# Altium footprint library ACTION_PinHeader.PcbLib: 155 footprints (part 5 of 10)
Each footprint in its own frame and in the unit in brackets; x right, y up, seen from the top. Pads: shape width x height; smd on the part's side, far side on the other; paste and mask are expansions set on the pad; w line width, h text height; cw(c..) or ccw(c..) is an arc to the next point about the centre after c.
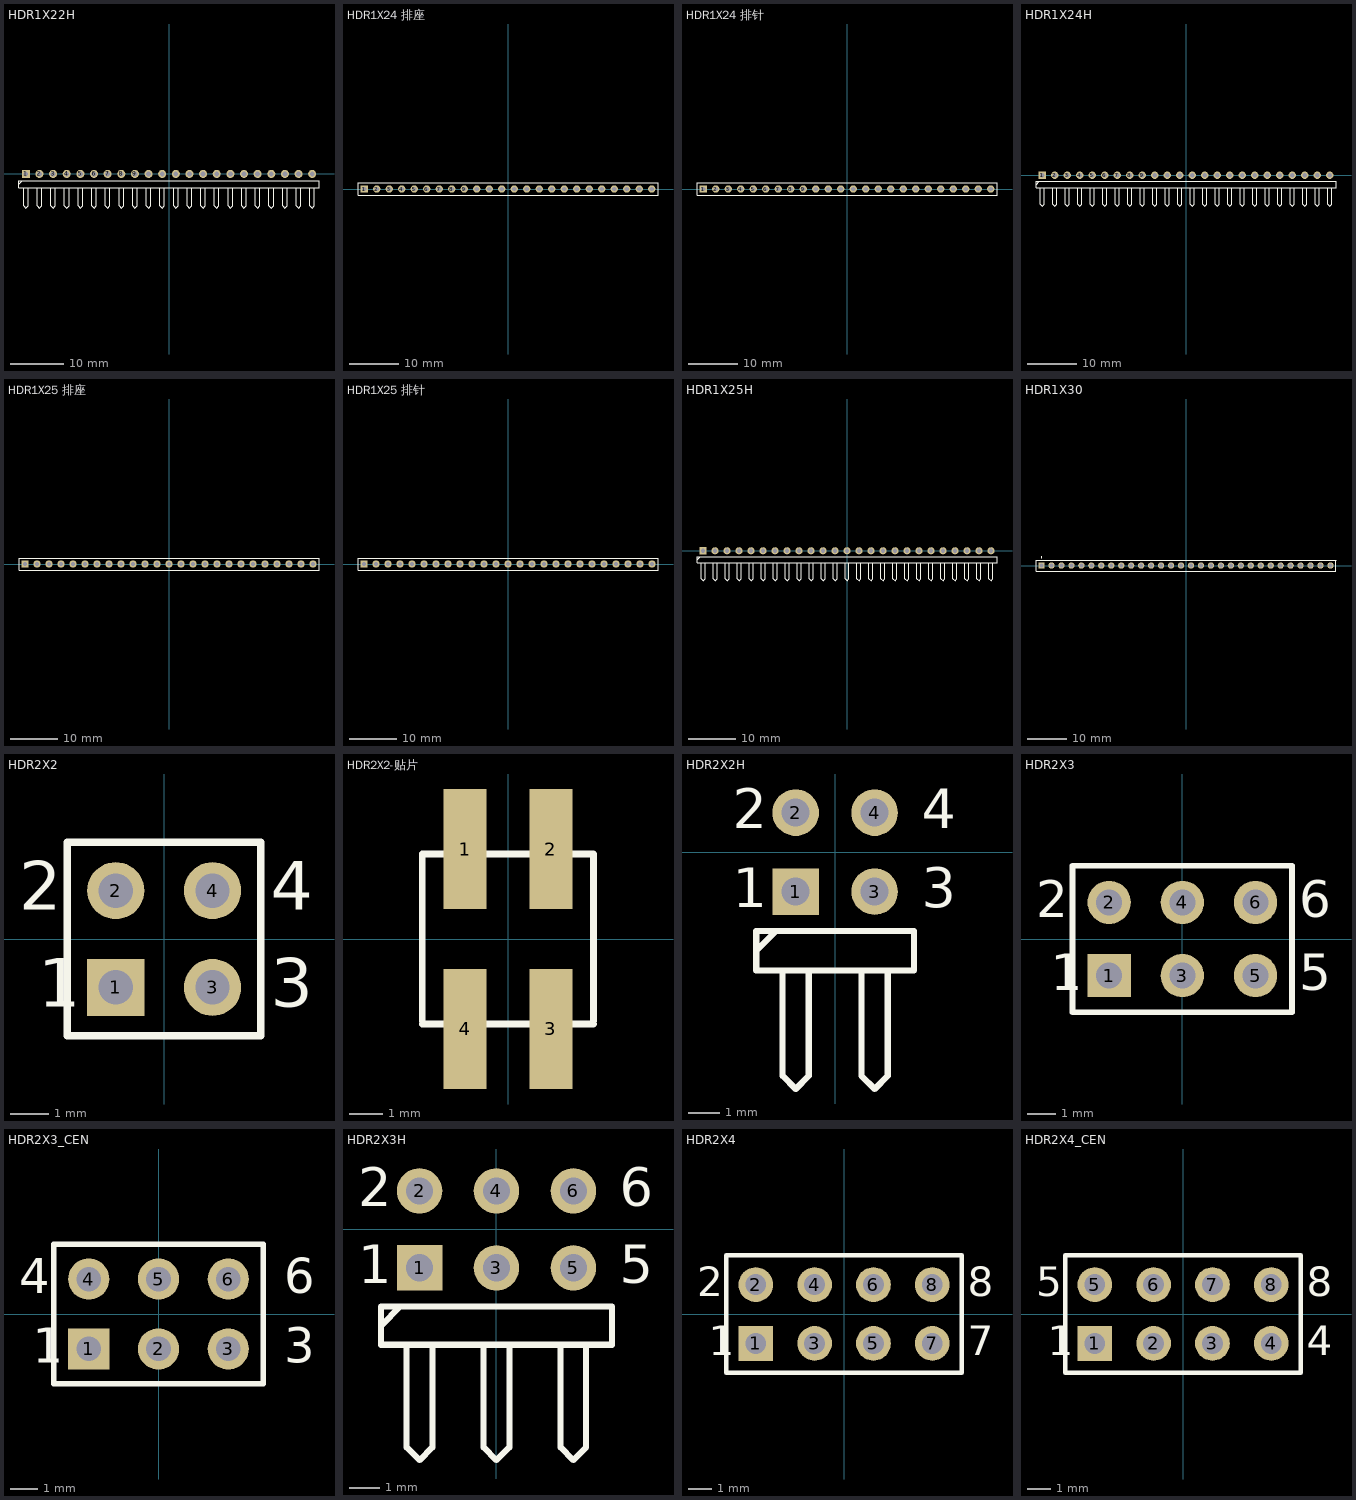
[diagram p4: the footprints below, top view; thin cyan lines are the x and y axes]

## HDR1X22H [mm] "Connector; Header; 22 Position; Right Angle"
pads (22):
  rect 1.5x1.5 hole 0.9: 1(-26.67,0)
  round 1.5 hole 0.9: 2(-24.13,0) 3(-21.59,0) 4(-19.05,0) 5(-16.51,0) 6(-13.97,0) 7(-11.43,0) 8(-8.89,0) 9(-6.35,0) 10(-3.81,0) 11(-1.27,0) 12(1.27,0) 13(3.81,0) 14(6.35,0) 15(8.89,0) 16(11.43,0) 17(13.97,0) 18(16.51,0) 19(19.05,0) 20(21.59,0) 21(24.13,0) 22(26.67,0)
Top Overlay:
  lines w0.2: -27.94,-1.905 -27.305,-1.27 ; -27.093,-2.54 -27.093,-5.927 -26.67,-6.35 -26.247,-5.927 -26.247,-2.54 ; -24.553,-2.54 -24.553,-5.927 -24.13,-6.35 -23.707,-5.927 -23.707,-2.54 ; -22.013,-2.54 -22.013,-5.927 -21.59,-6.35 -21.167,-5.927 -21.167,-2.54 ; -19.473,-2.54 -19.473,-5.927 -19.05,-6.35 -18.627,-5.927 -18.627,-2.54 ; -16.933,-2.54 -16.933,-5.927 -16.51,-6.35 -16.087,-5.927 -16.087,-2.54 ; -14.393,-2.54 -14.393,-5.927 -13.97,-6.35 -13.547,-5.927 -13.547,-2.54 ; -11.853,-2.54 -11.853,-5.927 -11.43,-6.35 -11.007,-5.927 -11.007,-2.54 ; -9.313,-2.54 -9.313,-5.927 -8.89,-6.35 -8.467,-5.927 -8.467,-2.54 ; -6.773,-2.54 -6.773,-5.927 -6.35,-6.35 -5.927,-5.927 -5.927,-2.54 ; -4.233,-2.54 -4.233,-5.927 -3.81,-6.35 -3.387,-5.927 -3.387,-2.54 ; -1.693,-2.54 -1.693,-5.927 -1.27,-6.35 -0.847,-5.927 -0.847,-2.54 ; 0.847,-2.54 0.847,-5.927 1.27,-6.35 1.693,-5.927 1.693,-2.54 ; 3.387,-2.54 3.387,-5.927 3.81,-6.35 4.233,-5.927 4.233,-2.54 ; 5.927,-2.54 5.927,-5.927 6.35,-6.35 6.773,-5.927 6.773,-2.54 ; 8.467,-2.54 8.467,-5.927 8.89,-6.35 9.313,-5.927 9.313,-2.54 ; 11.007,-2.54 11.007,-5.927 11.43,-6.35 11.853,-5.927 11.853,-2.54 ; 13.547,-2.54 13.547,-5.927 13.97,-6.35 14.393,-5.927 14.393,-2.54 ; 16.087,-2.54 16.087,-5.927 16.51,-6.35 16.933,-5.927 16.933,-2.54 ; 18.627,-2.54 18.627,-5.927 19.05,-6.35 19.473,-5.927 19.473,-2.54 ; 21.167,-2.54 21.167,-5.927 21.59,-6.35 22.013,-5.927 22.013,-2.54 ; 23.707,-2.54 23.707,-5.927 24.13,-6.35 24.553,-5.927 24.553,-2.54 ; 26.247,-2.54 26.247,-5.927 26.67,-6.35 27.093,-5.927 27.093,-2.54 ; -27.94,-2.54 27.94,-2.54 27.94,-1.27 -26.035,-1.27 -27.94,-1.27 -27.94,-2.54
3D body "65818.stp": height 2.77, standoff -2.77, extent -28.016,-10.055 27.864,0.305

## HDR1X24 排座 [mm] "Connector; Header; 24 Position"
pads (24):
  rect 1.5x1.5 hole 0.9: 1(-29.21,0)
  round 1.5 hole 0.9: 2(-26.67,0) 3(-24.13,0) 4(-21.59,0) 5(-19.05,0) 6(-16.51,0) 7(-13.97,0) 8(-11.43,0) 9(-8.89,0) 10(-6.35,0) 11(-3.81,0) 12(-1.27,0) 13(1.27,0) 14(3.81,0) 15(6.35,0) 16(8.89,0) 17(11.43,0) 18(13.97,0) 19(16.51,0) 20(19.05,0) 21(21.59,0) 22(24.13,0) 23(26.67,0) 24(29.21,0)
Top Overlay:
  lines w0.2: -30.48,-1.27 -30.48,1.27 -28.575,1.27 30.48,1.27 30.48,-1.27 -30.48,-1.27
3D body "pcb_connector_801-87-024-66-001101.stp": height 7, standoff -3.8, extent -30.48,-1.27 30.48,1.27

## HDR1X24 排针 [mm] "Connector; Header; 24 Position"
pads (24):
  rect 1.5x1.5 hole 0.9: 1(-29.21,0)
  round 1.5 hole 0.9: 2(-26.67,0) 3(-24.13,0) 4(-21.59,0) 5(-19.05,0) 6(-16.51,0) 7(-13.97,0) 8(-11.43,0) 9(-8.89,0) 10(-6.35,0) 11(-3.81,0) 12(-1.27,0) 13(1.27,0) 14(3.81,0) 15(6.35,0) 16(8.89,0) 17(11.43,0) 18(13.97,0) 19(16.51,0) 20(19.05,0) 21(21.59,0) 22(24.13,0) 23(26.67,0) 24(29.21,0)
Top Overlay:
  lines w0.2: -30.48,-1.27 -30.48,1.27 -28.575,1.27 30.48,1.27 30.48,-1.27 -30.48,-1.27

## HDR1X24H [mm] "Connector; Header; 24 Position; Right Angle"
pads (24):
  rect 1.5x1.5 hole 0.9: 1(-29.21,0)
  round 1.5 hole 0.9: 2(-26.67,0) 3(-24.13,0) 4(-21.59,0) 5(-19.05,0) 6(-16.51,0) 7(-13.97,0) 8(-11.43,0) 9(-8.89,0) 10(-6.35,0) 11(-3.81,0) 12(-1.27,0) 13(1.27,0) 14(3.81,0) 15(6.35,0) 16(8.89,0) 17(11.43,0) 18(13.97,0) 19(16.51,0) 20(19.05,0) 21(21.59,0) 22(24.13,0) 23(26.67,0) 24(29.21,0)
Top Overlay:
  lines w0.2: -30.48,-1.905 -29.845,-1.27 ; -29.633,-2.54 -29.633,-5.927 -29.21,-6.35 -28.787,-5.927 -28.787,-2.54 ; -27.093,-2.54 -27.093,-5.927 -26.67,-6.35 -26.247,-5.927 -26.247,-2.54 ; -24.553,-2.54 -24.553,-5.927 -24.13,-6.35 -23.707,-5.927 -23.707,-2.54 ; -22.013,-2.54 -22.013,-5.927 -21.59,-6.35 -21.167,-5.927 -21.167,-2.54 ; -19.473,-2.54 -19.473,-5.927 -19.05,-6.35 -18.627,-5.927 -18.627,-2.54 ; -16.933,-2.54 -16.933,-5.927 -16.51,-6.35 -16.087,-5.927 -16.087,-2.54 ; -14.393,-2.54 -14.393,-5.927 -13.97,-6.35 -13.547,-5.927 -13.547,-2.54 ; -11.853,-2.54 -11.853,-5.927 -11.43,-6.35 -11.007,-5.927 -11.007,-2.54 ; -9.313,-2.54 -9.313,-5.927 -8.89,-6.35 -8.467,-5.927 -8.467,-2.54 ; -6.773,-2.54 -6.773,-5.927 -6.35,-6.35 -5.927,-5.927 -5.927,-2.54 ; -4.233,-2.54 -4.233,-5.927 -3.81,-6.35 -3.387,-5.927 -3.387,-2.54 ; -1.693,-2.54 -1.693,-5.927 -1.27,-6.35 -0.847,-5.927 -0.847,-2.54 ; 0.847,-2.54 0.847,-5.927 1.27,-6.35 1.693,-5.927 1.693,-2.54 ; 3.387,-2.54 3.387,-5.927 3.81,-6.35 4.233,-5.927 4.233,-2.54 ; 5.927,-2.54 5.927,-5.927 6.35,-6.35 6.773,-5.927 6.773,-2.54 ; 8.467,-2.54 8.467,-5.927 8.89,-6.35 9.313,-5.927 9.313,-2.54 ; 11.007,-2.54 11.007,-5.927 11.43,-6.35 11.853,-5.927 11.853,-2.54 ; 13.547,-2.54 13.547,-5.927 13.97,-6.35 14.393,-5.927 14.393,-2.54 ; 16.087,-2.54 16.087,-5.927 16.51,-6.35 16.933,-5.927 16.933,-2.54 ; 18.627,-2.54 18.627,-5.927 19.05,-6.35 19.473,-5.927 19.473,-2.54 ; 21.167,-2.54 21.167,-5.927 21.59,-6.35 22.013,-5.927 22.013,-2.54 ; 23.707,-2.54 23.707,-5.927 24.13,-6.35 24.553,-5.927 24.553,-2.54 ; 26.247,-2.54 26.247,-5.927 26.67,-6.35 27.093,-5.927 27.093,-2.54 ; 28.787,-2.54 28.787,-5.927 29.21,-6.35 29.633,-5.927 29.633,-2.54 ; -30.48,-2.54 30.48,-2.54 30.48,-1.27 -28.575,-1.27 -30.48,-1.27 -30.48,-2.54

## HDR1X25 排座 [mm] "Connector; Header; 25 Position"
pads (25):
  rect 1.5x1.5 hole 0.9: 1(-30.48,0)
  round 1.5 hole 0.9: 2(-27.94,0) 3(-25.4,0) 4(-22.86,0) 5(-20.32,0) 6(-17.78,0) 7(-15.24,0) 8(-12.7,0) 9(-10.16,0) 10(-7.62,0) 11(-5.08,0) 12(-2.54,0) 13(0,0) 14(2.54,0) 15(5.08,0) 16(7.62,0) 17(10.16,0) 18(12.7,0) 19(15.24,0) 20(17.78,0) 21(20.32,0) 22(22.86,0) 23(25.4,0) 24(27.94,0) 25(30.48,0)
Top Overlay:
  lines w0.2: -31.75,-1.27 -31.75,1.27 -29.845,1.27 31.75,1.27 31.75,-1.27 -31.75,-1.27
3D body "pcb_connector_801-87-025-66-001101.stp": height 7, standoff -3.8, extent -31.75,-1.27 31.75,1.27

## HDR1X25 排针 [mm] "Connector; Header; 25 Position"
pads (25):
  rect 1.5x1.5 hole 0.9: 1(-30.48,0)
  round 1.5 hole 0.9: 2(-27.94,0) 3(-25.4,0) 4(-22.86,0) 5(-20.32,0) 6(-17.78,0) 7(-15.24,0) 8(-12.7,0) 9(-10.16,0) 10(-7.62,0) 11(-5.08,0) 12(-2.54,0) 13(0,0) 14(2.54,0) 15(5.08,0) 16(7.62,0) 17(10.16,0) 18(12.7,0) 19(15.24,0) 20(17.78,0) 21(20.32,0) 22(22.86,0) 23(25.4,0) 24(27.94,0) 25(30.48,0)
Top Overlay:
  lines w0.2: -31.75,-1.27 31.75,-1.27 31.75,1.27 -29.845,1.27 -31.75,1.27 -31.75,-1.27

## HDR1X25H [mm] "Connector; Header; 25 Position; Right Angle"
pads (25):
  rect 1.5x1.5 hole 0.9: 1(-30.48,0)
  round 1.5 hole 0.9: 2(-27.94,0) 3(-25.4,0) 4(-22.86,0) 5(-20.32,0) 6(-17.78,0) 7(-15.24,0) 8(-12.7,0) 9(-10.16,0) 10(-7.62,0) 11(-5.08,0) 12(-2.54,0) 13(0,0) 14(2.54,0) 15(5.08,0) 16(7.62,0) 17(10.16,0) 18(12.7,0) 19(15.24,0) 20(17.78,0) 21(20.32,0) 22(22.86,0) 23(25.4,0) 24(27.94,0) 25(30.48,0)
Top Overlay:
  lines w0.2: -31.75,-1.905 -31.115,-1.27 ; -30.903,-2.54 -30.903,-5.927 -30.48,-6.35 -30.057,-5.927 -30.057,-2.54 ; -28.363,-2.54 -28.363,-5.927 -27.94,-6.35 -27.517,-5.927 -27.517,-2.54 ; -25.823,-2.54 -25.823,-5.927 -25.4,-6.35 -24.977,-5.927 -24.977,-2.54 ; -23.283,-2.54 -23.283,-5.927 -22.86,-6.35 -22.437,-5.927 -22.437,-2.54 ; -20.743,-2.54 -20.743,-5.927 -20.32,-6.35 -19.897,-5.927 -19.897,-2.54 ; -18.203,-2.54 -18.203,-5.927 -17.78,-6.35 -17.357,-5.927 -17.357,-2.54 ; -15.663,-2.54 -15.663,-5.927 -15.24,-6.35 -14.817,-5.927 -14.817,-2.54 ; -13.123,-2.54 -13.123,-5.927 -12.7,-6.35 -12.277,-5.927 -12.277,-2.54 ; -10.583,-2.54 -10.583,-5.927 -10.16,-6.35 -9.737,-5.927 -9.737,-2.54 ; -8.043,-2.54 -8.043,-5.927 -7.62,-6.35 -7.197,-5.927 -7.197,-2.54 ; -5.503,-2.54 -5.503,-5.927 -5.08,-6.35 -4.657,-5.927 -4.657,-2.54 ; -2.963,-2.54 -2.963,-5.927 -2.54,-6.35 -2.117,-5.927 -2.117,-2.54 ; -0.423,-2.54 -0.423,-5.927 0,-6.35 0.423,-5.927 0.423,-2.54 ; 2.117,-2.54 2.117,-5.927 2.54,-6.35 2.963,-5.927 2.963,-2.54 ; 4.657,-2.54 4.657,-5.927 5.08,-6.35 5.503,-5.927 5.503,-2.54 ; 7.197,-2.54 7.197,-5.927 7.62,-6.35 8.043,-5.927 8.043,-2.54 ; 9.737,-2.54 9.737,-5.927 10.16,-6.35 10.583,-5.927 10.583,-2.54 ; 12.277,-2.54 12.277,-5.927 12.7,-6.35 13.123,-5.927 13.123,-2.54 ; 14.817,-2.54 14.817,-5.927 15.24,-6.35 15.663,-5.927 15.663,-2.54 ; 17.357,-2.54 17.357,-5.927 17.78,-6.35 18.203,-5.927 18.203,-2.54 ; 19.897,-2.54 19.897,-5.927 20.32,-6.35 20.743,-5.927 20.743,-2.54 ; 22.437,-2.54 22.437,-5.927 22.86,-6.35 23.283,-5.927 23.283,-2.54 ; 24.977,-2.54 24.977,-5.927 25.4,-6.35 25.823,-5.927 25.823,-2.54 ; 27.517,-2.54 27.517,-5.927 27.94,-6.35 28.363,-5.927 28.363,-2.54 ; 30.057,-2.54 30.057,-5.927 30.48,-6.35 30.903,-5.927 30.903,-2.54 ; -31.75,-2.54 31.75,-2.54 31.75,-1.27 -29.845,-1.27 -31.75,-1.27 -31.75,-2.54

## HDR1X30 [mm] "Connector; Header; 30 Position"
pads (30):
  rect 1.6x1.6 hole 0.99: 1(-36.83,0)
  round 1.6 hole 0.99: 2(-34.29,0) 3(-31.75,0) 4(-29.21,0) 5(-26.67,0) 6(-24.13,0) 7(-21.59,0) 8(-19.05,0) 9(-16.51,0) 10(-13.97,0) 11(-11.43,0) 12(-8.89,0) 13(-6.35,0) 14(-3.81,0) 15(-1.27,0) 16(1.27,0) 17(3.81,0) 18(6.35,0) 19(8.89,0) 20(11.43,0) 21(13.97,0) 22(16.51,0) 23(19.05,0) 24(21.59,0) 25(24.13,0) 26(26.67,0) 27(29.21,0) 28(31.75,0) 29(34.29,0) 30(36.83,0)
Top Overlay:
  circle w0.25: c-36.83,2.05 r0.125
  lines w0.2: -38.23,-1.4 38.23,-1.4 38.23,1.4 -38.23,1.4 -38.23,-1.4

## HDR2X2 [mm] "Connector; Header; 2x2 Position"
pads (4):
  rect 1.5x1.5 hole 0.9: 1(-1.27,-1.27)
  round 1.5 hole 0.9: 2(-1.27,1.27) 3(1.27,-1.27) 4(1.27,1.27)
Top Overlay:
  lines w0.2: -2.54,-2.54 2.54,-2.54 2.54,2.54 -2.54,2.54 -2.54,-2.54
  text "3" at 2.794,-1.778 h1.27
  text "4" at 2.794,0.762 h1.27
  text "2" at -3.81,0.762 h1.27
  text "1" at -3.302,-1.778 h1.27
3D body "HEADER 2X2.STEP": height 10.1, standoff -1.5, extent -2.54,-2.515 2.54,2.565

## HDR2X2-贴片 [mil]
pads (4):
  rect 50x140 smd: 1(-50,105) 2(50,105) 3(50,-105) 4(-50,-105)
Top Overlay:
  lines w7.87: -100.18,-99.24 99.82,-99.24 ; -100.18,-95.31 -100.18,4.69 ; -100.18,-0.82 -100.18,99.18 99.82,99.18 99.82,-0.82 ; 99.82,-95.31 99.82,4.69

## HDR2X2H [mm] "Connector; Header; 2x2 Position; Right Angle"
pads (4):
  rect 1.5x1.5 hole 0.9: 1(-1.27,-1.27)
  round 1.5 hole 0.9: 2(-1.27,1.27) 3(1.27,-1.27) 4(1.27,1.27)
Top Overlay:
  lines w0.2: -2.54,-3.175 -1.905,-2.54 ; -1.693,-3.81 -1.693,-7.197 -1.27,-7.62 -0.847,-7.197 -0.847,-3.81 ; 0.847,-3.81 0.847,-7.197 1.27,-7.62 1.693,-7.197 1.693,-3.81 ; -2.54,-3.81 2.54,-3.81 2.54,-2.54 -2.54,-2.54 -2.54,-3.81
  text "3" at 2.794,-1.778 h1.27
  text "4" at 2.794,0.762 h1.27
  text "2" at -3.302,0.762 h1.27
  text "1" at -3.302,-1.778 h1.27
3D body "12580.stp": height 5.55, standoff -3.22, extent -2.565,-11.831 2.515,1.524

## HDR2X3 [mm] "Connector; Header; 3x2 Position"
pads (6):
  rect 1.5x1.5 hole 0.9: 1(-2.54,-1.27)
  round 1.5 hole 0.9: 2(-2.54,1.27) 3(0,-1.27) 4(0,1.27) 5(2.54,-1.27) 6(2.54,1.27)
Top Overlay:
  lines w0.2: -1.058,-2.54 3.81,-2.54 ; 3.81,-2.54 -3.81,-2.54 -3.81,2.54 3.81,2.54 3.81,-2.54
  text "1" at -4.572,-1.778 h1.27
  text "2" at -5.08,0.762 h1.27
  text "5" at 4.064,-1.778 h1.27
  text "6" at 4.064,0.762 h1.27
3D body "HEADER 3X2.STEP": height 10.1, standoff -1.5, extent -3.835,-2.54 3.785,2.54

## HDR2X3_CEN [mm] "Connector; Header; 3x2 Position"
pads (6):
  rect 1.5x1.5 hole 0.9: 1(-2.54,-1.27)
  round 1.5 hole 0.9: 2(0,-1.27) 3(2.54,-1.27) 4(-2.54,1.27) 5(0,1.27) 6(2.54,1.27)
Top Overlay:
  lines w0.2: -3.81,-2.54 3.81,-2.54 3.81,2.54 -3.81,2.54 -3.81,-2.54
  text "6" at 4.572,0.762 h1.27
  text "3" at 4.572,-1.778 h1.27
  text "1" at -4.572,-1.778 h1.27
  text "4" at -5.08,0.762 h1.27
3D body "HEADER 3X2.STEP": height 10.1, standoff -1.5, extent -3.81,-2.54 3.81,2.54

## HDR2X3H [mm] "Connector; Header; 3x2 Position; Right Angle"
pads (6):
  rect 1.5x1.5 hole 0.9: 1(-2.54,-1.27)
  round 1.5 hole 0.9: 2(-2.54,1.27) 3(0,-1.27) 4(0,1.27) 5(2.54,-1.27) 6(2.54,1.27)
Top Overlay:
  lines w0.2: -3.81,-3.175 -3.175,-2.54 ; -2.963,-3.81 -2.963,-7.197 -2.54,-7.62 -2.117,-7.197 -2.117,-3.81 ; -0.423,-3.81 -0.423,-7.197 0,-7.62 0.423,-7.197 0.423,-3.81 ; 2.117,-3.81 2.117,-7.197 2.54,-7.62 2.963,-7.197 2.963,-3.81 ; -3.81,-3.81 3.81,-3.81 3.81,-2.54 -3.81,-2.54 -3.81,-3.81
  text "2" at -4.572,0.762 h1.27
  text "1" at -4.572,-1.778 h1.27
  text "5" at 4.064,-1.778 h1.27
  text "6" at 4.064,0.762 h1.27
3D body "12581.stp": height 5.55, standoff -3.22, extent -3.708,-11.881 3.912,1.474

## HDR2X4 [mm] "Connector; Header; 4x2 Position"
pads (8):
  rect 1.5x1.5 hole 0.9: 1(-3.81,-1.27)
  round 1.5 hole 0.9: 2(-3.81,1.27) 3(-1.27,-1.27) 4(-1.27,1.27) 5(1.27,-1.27) 6(1.27,1.27) 7(3.81,-1.27) 8(3.81,1.27)
Top Overlay:
  lines w0.2: -5.08,-2.54 5.08,-2.54 5.08,2.54 -5.08,2.54 -5.08,-2.54
  text "2" at -6.35,0.762 h1.27
  text "1" at -5.842,-1.778 h1.27
  text "7" at 5.334,-1.778 h1.27
  text "8" at 5.334,0.762 h1.27
3D body "HEADER 4X2.STEP": height 10.1, standoff -1.5, extent -5.055,-2.54 5.105,2.54

## HDR2X4_CEN [mm] "Connector; Header; 4x2 Position"
pads (8):
  rect 1.5x1.5 hole 0.9: 1(-3.81,-1.27)
  round 1.5 hole 0.9: 2(-1.27,-1.27) 3(1.27,-1.27) 4(3.81,-1.27) 5(-3.81,1.27) 6(-1.27,1.27) 7(1.27,1.27) 8(3.81,1.27)
Top Overlay:
  lines w0.2: -5.08,-2.54 5.08,-2.54 5.08,2.54 -5.08,2.54 -5.08,-2.54
  text "5" at -6.35,0.762 h1.27
  text "1" at -5.842,-1.778 h1.27
  text "4" at 5.334,-1.778 h1.27
  text "8" at 5.334,0.762 h1.27
3D body "HEADER 4X2.STEP": height 10.1, standoff -1.5, extent -5.105,-2.54 5.055,2.54